# Altium schematic symbol library AA_Symbols.SchLib: 1017 symbols (part 7 of 7) (continued)
## SJA1105
designator U?
Ethernet Switch IEEE 802.3 SPI Interface 159-LFBGA (12x12); Manufacturer: NXP; Outset P/N: PN-0008215
footprint BGA159NP80A14X14_1200X1200X150B45N (Ball Grid Array (BGA, Non-collapsing), 0.80 mm pitch, square; 173 pin, 12.00 mm L X 12.00 mm W X 1.50 mm H body)
part A pins: A1 VSS (power), A14 VSS (power), B13 VSS (power), E5 VSS (power), E6 VSS (power), E7 VSS (power), E8 VSS (power), E9 VSS (power), E10 VSS (power), F5 VSS (power), F6 VSS (power), F7 VSS (power), F8 VSS (power), F9 VSS (power), F10 VSS (power), G5 VSS (power), G6 VSS (power), G7 VSS (power), G8 VSS (power), G9 VSS (power), G10 VSS (power), H5 VSS (power), H6 VSS (power), H7 VSS (power), H8 VSS (power), H9 VSS (power), H10 VSS (power), J5 VSS (power), J6 VSS (power), J7 VSS (power), J8 VSS (power), J9 VSS (power), J10 VSS (power), K4 VSS (power), K5 VSS (power), K6 VSS (power), K7 VSS (power), K8 VSS (power), K9 VSS (power), K10 VSS (power), L4 i.c. (power), L7 VSS (power), N2 VSS (power), N13 VSS (power), P1 VSS (power), P14 VSS (power)
part B pins: D4 VDDIO_MII0 (power), D5 VDDIO_MII1 (power), D6 VDD_CORE (power), D7 VDDIO_MII1 (power), D8 VDDIO_MII1 (power), D9 VDD_CORE (power), D10 VDDIO_MII2 (power), D11 VDDIO_MII2 (power), E4 VDDIO_MII0 (power), E11 VDDIO_MII2 (power), F4 VDD_CORE (power), F11 VDD_CORE (power), G4 VDDIO_MII0 (power), G11 VDDIO_MII3 (power), H11 VDDIO_MII3 (power), J4 VDD_CORE (power), J11 VDD_CORE (power), K11 VDDIO_MII3 (power), L5 VDDIO_HOST (power), L6 VDD_CORE (power), L8 VDDIO_MII4 (power), L9 VDD_CORE (power), L10 VDDIO_MII4 (power), L11 VDDIO_MII4 (power), N4 PTP_CLK (out), P3 ~{RST} (in)
part C pins: H1 CLK_OUT (out), H4 VDDIO_CLO (power), J1 VDDA_PLL (power), J2 VSSA_PLL (power), K1 VDDA_OSC (power), K2 OSC_IN (in), L1 OSC_OUT (out), L2 VSSA_OSC (power)
part D pins: M1 ~{TRST} (in), M2 TDI (in), N1 TCK (in), N3 TDO (out), N5 SDI (in), N6 ~{SS} (in), P2 TMS (in), P4 SDO (out), P5 SCK (in)
part E pins: A2 MII0_TXD0 (out), A3 MII0_TX_ER (out), B1 MII0_TXD1 (out), C1 MII0_TXD3 (out), C2 MII0_TXD2 (out), D1 MII0_TX_CLK (power), D2 MII0_TX_EN (out), E1 MII0_RXD0 (in), E2 MII0_RX_CLK (power), F1 MII0_RXD2 (in), F2 MII0_RXD1 (in), G1 MII0_RX_DV (in), G2 MII0_RXD3 (in), H2 MII0_RX_ER (in)
part F pins: A4 MII1_RX_DV (in), A5 MII1_RXD2 (in), A6 MII1_RXD0 (in), A7 MII1_TX_CLK (power), A8 MII1_TXD3 (out), A9 MII1_TXD1 (out), A10 MII1_TX_ER (out), B3 MII1_RX_ER (in), B4 MII1_RXD3 (in), B5 MII1_RXD1 (in), B6 MII1_RX_CLK (power), B7 MII1_TX_EN (out), B8 MII1_TXD2 (out), B9 MII1_TXD0 (out)
part G pins: A11 MII2_RX_DV (in), A12 MII2_RXD2 (in), A13 MII2_RXD0 (in), B10 MII2_RX_ER (in), B11 MII2_RXD3 (in), B12 MII2_RXD1 (in), B14 MII2_RX_CLK (power), C13 MII2_TX_EN (out), C14 MII2_TX_CLK (power), D13 MII2_TXD2 (out), D14 MII2_TXD3 (out), E13 MII2_TXD0 (out), E14 MII2_TXD1 (out), F14 MII2_TX_ER (out)
part H pins: F13 MII3_RX_ER (in), G13 MII3_RXD3 (in), G14 MII3_RX_DV (in), H13 MII3_RXD1 (in), H14 MII3_RXD2 (in), J13 MII3_RX_CLK (power), J14 MII3_RXD0 (in), K13 MII3_TX_EN (out), K14 MII3_TX_CLK (power), L13 MII3_TXD2 (out), L14 MII3_TXD3 (out), M13 MII3_TXD0 (out), M14 MII3_TXD1 (out), N14 MII3_TX_ER (out)
part I pins: N7 MII4_TXD1 (out), N8 MII4_TXD3 (out), N9 MII4_TX_CLK (power), N10 MII4_RXD0 (in), N11 MII4_RXD2 (in), N12 MII4_RX_DV (in), P6 MII4_TX_ER (out), P7 MII4_TXD0 (out), P8 MII4_TXD2 (out), P9 MII4_TX_EN (out), P10 MII4_RX_CLK (power), P11 MII4_RXD1 (in), P12 MII4_RXD3 (in), P13 MII4_RX_ER (in)
part C text: CGU
part D text: SPI; JTAG
part E text: MII0
part F text: MII1
part G text: MII2
part H text: MII3
part I text: MII4

## STANDOFF_STEEL_M2.5_H5MM
designator M?, comment Manufacturer P/N: 9774050151R  (hidden comment: M2.5/H5MM)  (net tie, no BOM)
ROUND STANDOFF M2.5 STEEL 5MM; Manufacturer: Wurth Electronics; Outset P/N: PN-0001700; Value: M2.5/H5MM
footprint NUV_NET_TIE_0201 (Footprint not found)
footprint STANDOFF_WURTH_9774050151R (M2.5 X 5MM, SMT, PCB MOUNT)
pins: 1

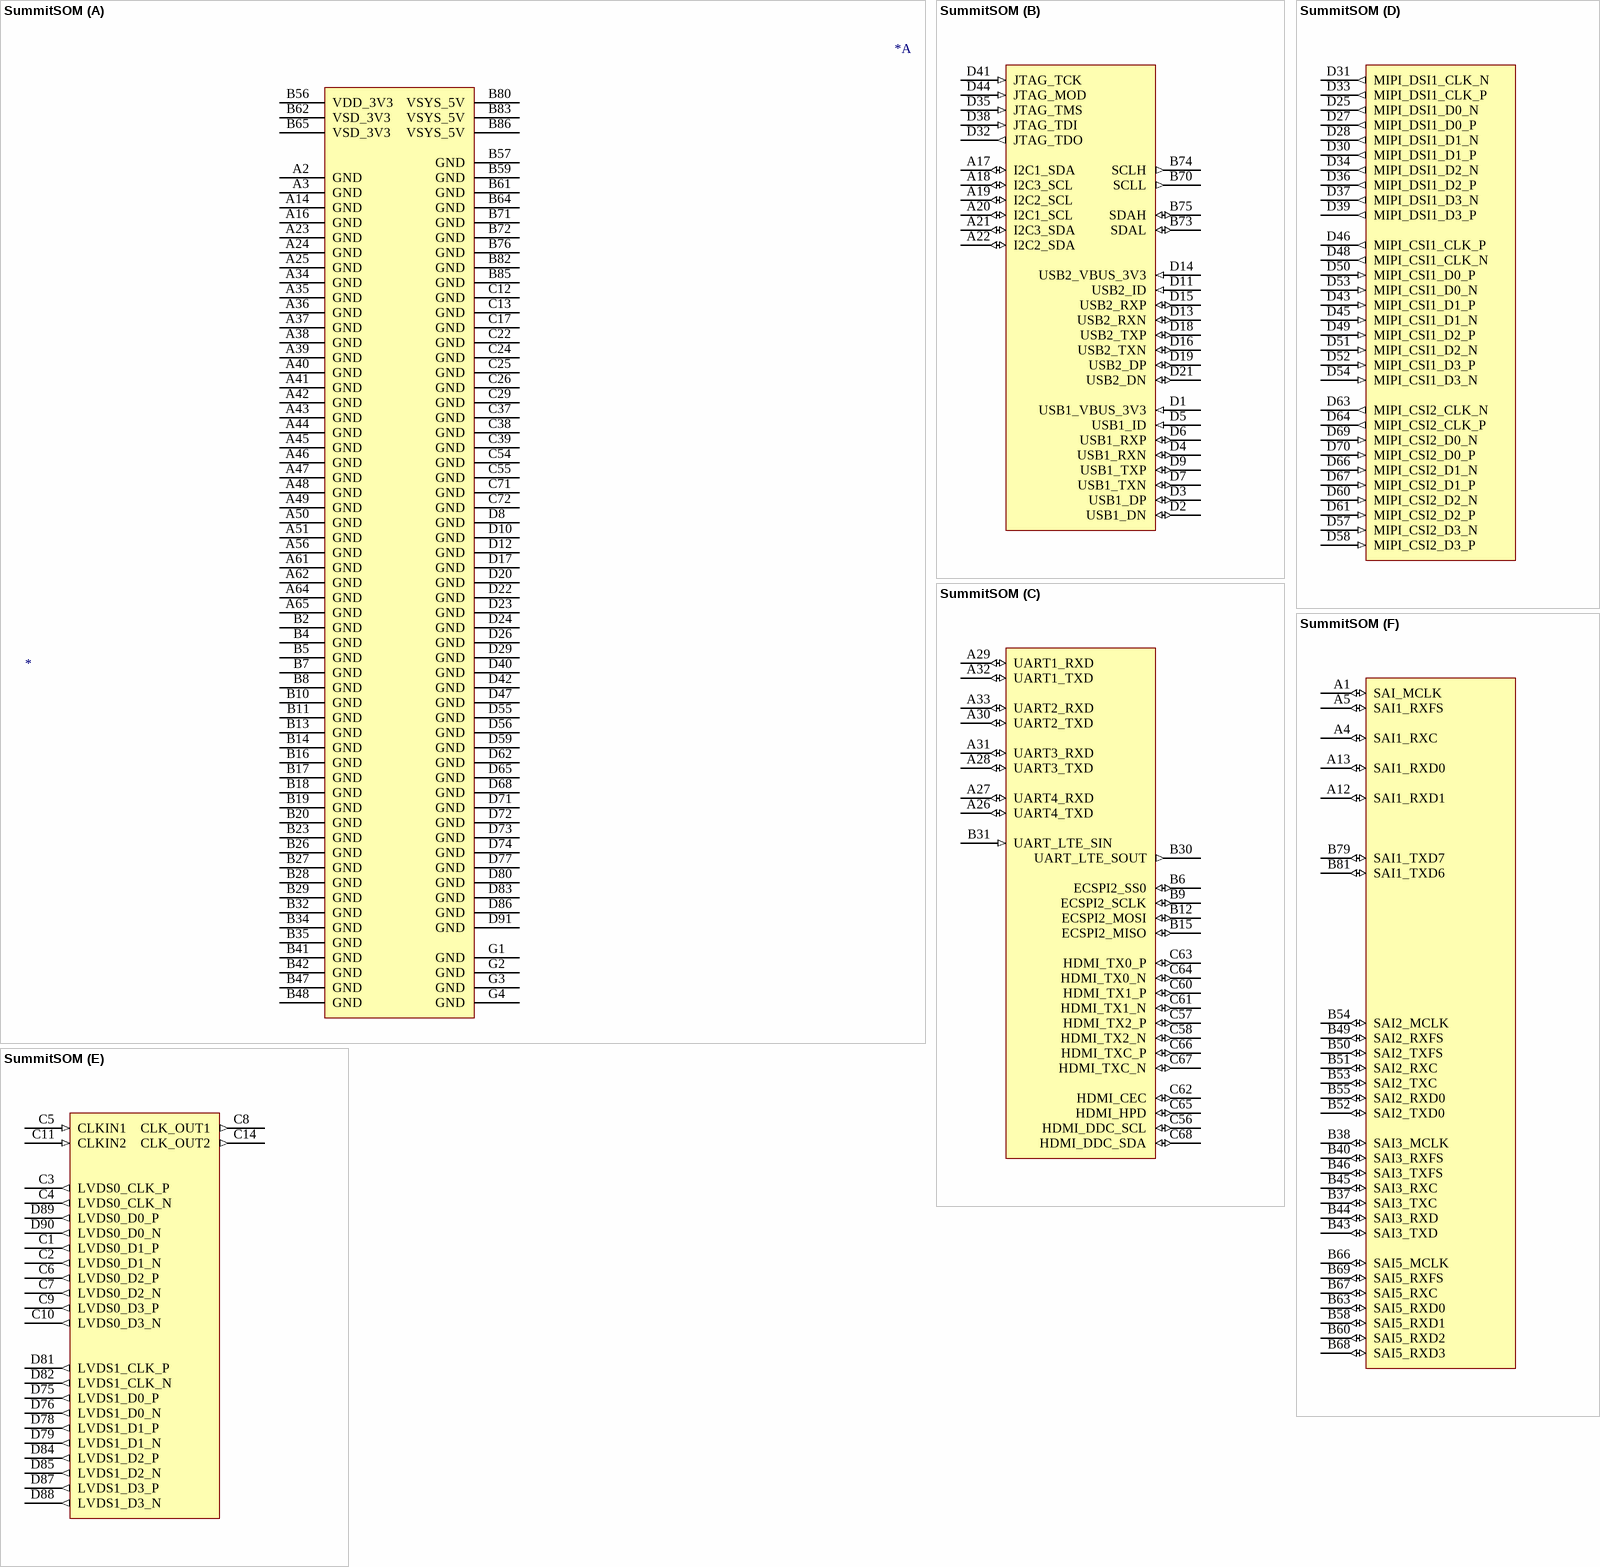
[diagram p40: symbol SummitSOM]

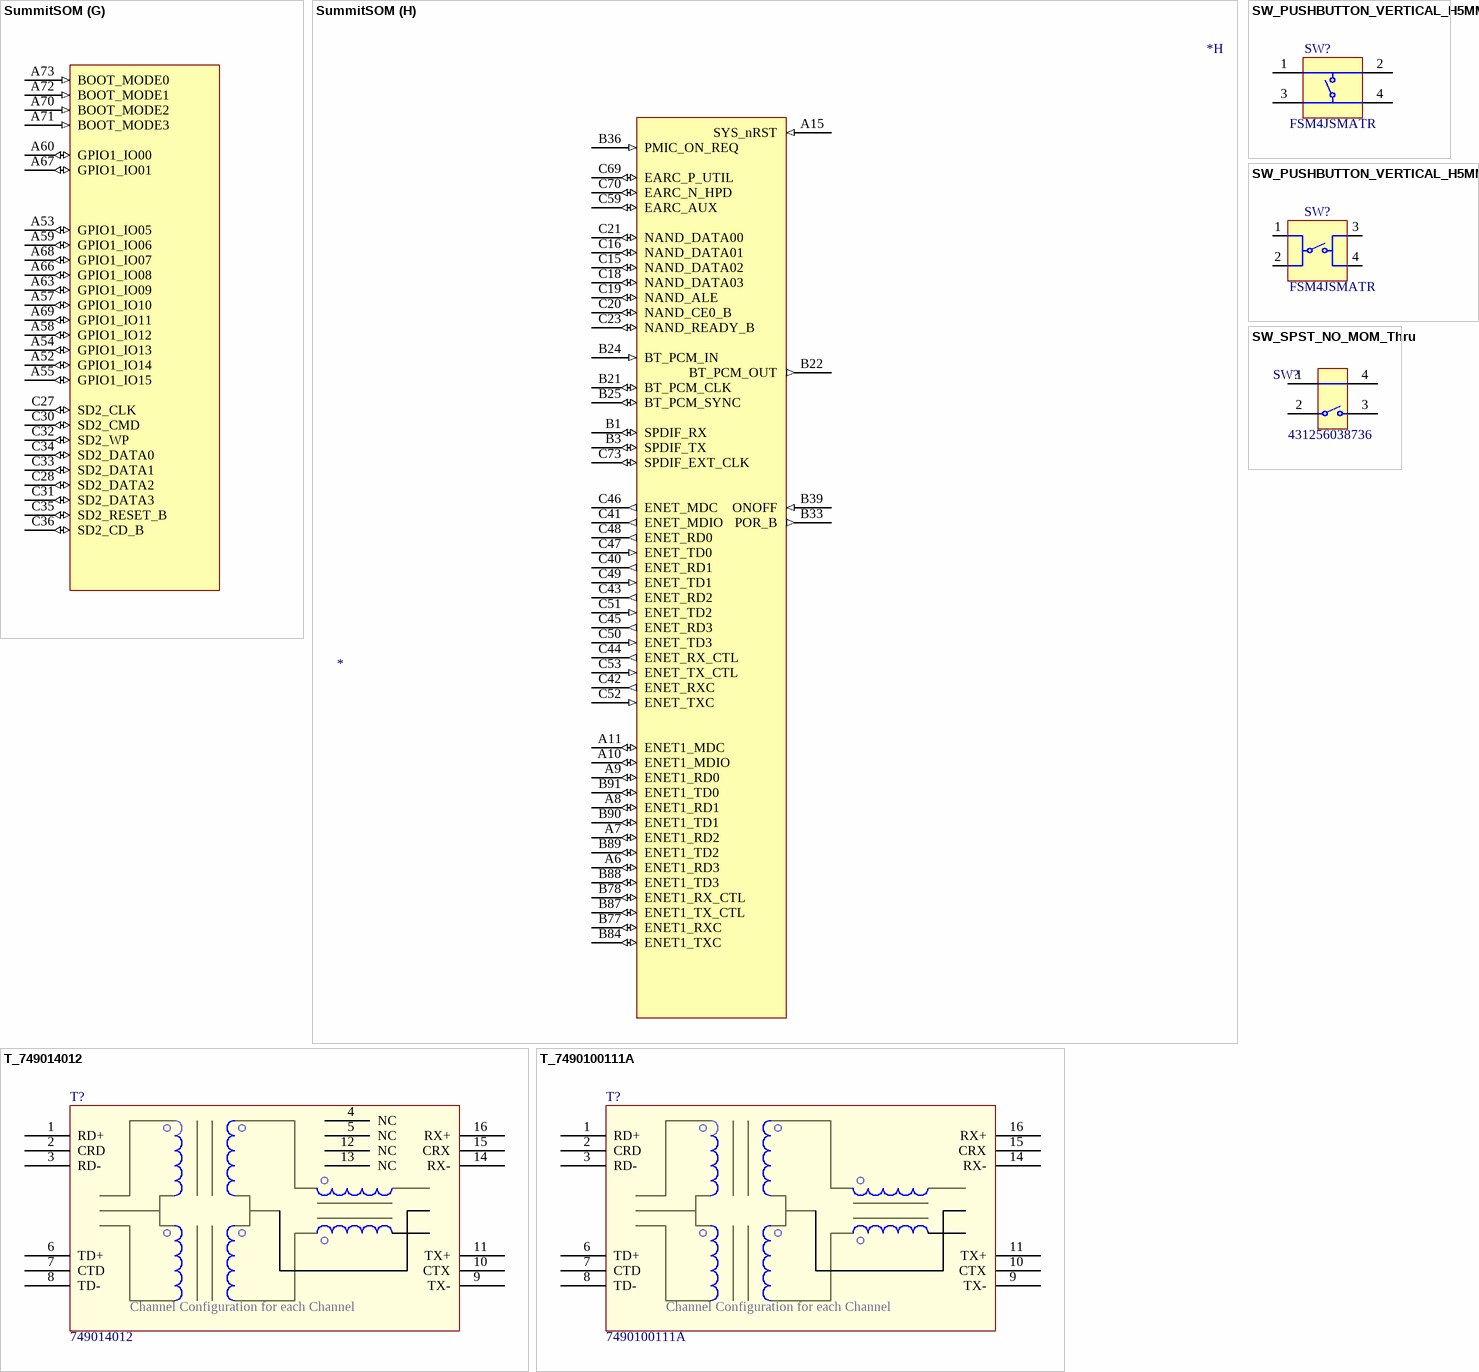
[diagram p41: symbols SummitSOM to T_7490100111A]

## SummitSOM
designator *
footprint SUMMITSOM_8M (Laird, TurboSOM, Platform Side)
part A pins: A2 GND (power), A3 GND (power), A14 GND (power), A16 GND (power), A23 GND (power), A24 GND (power), A25 GND (power), A34 GND (power), A35 GND (power), A36 GND (power), A37 GND (power), A38 GND (power), A39 GND (power), A40 GND (power), A41 GND (power), A42 GND (power), A43 GND (power), A44 GND (power), A45 GND (power), A46 GND (power), A47 GND (power), A48 GND (power), A49 GND (power), A50 GND (power), A51 hidden, A51 GND (power), A56 GND (power), A61 GND (power), A62 GND (power), A64 GND (power), A65 GND (power), B2 GND (power), B4 GND (power), B5 GND (power), B7 GND (power), B8 GND (power), B10 GND (power), B11 GND (power), B13 GND (power), B14 GND (power), B16 GND (power), B17 GND (power), B18 GND (power), B19 GND (power), B20 GND (power), B23 GND (power), B26 GND (power), B27 GND (power), B28 GND (power), B29 GND (power), B32 GND (power), B34 GND (power), B35 GND (power), B41 GND (power), B42 GND (power), B47 GND (power), B48 GND (power), B56 VDD_3V3 (power), B57 GND (power), B59 GND (power), B61 GND (power), B62 VSD_3V3 (power), B64 GND (power), B65 VSD_3V3 (power), B71 GND (power), B72 GND (power), B76 GND (power), B80 VSYS_5V (power), B82 GND (power), B83 VSYS_5V (power), B85 GND (power), B86 VSYS_5V (power), C12 GND (power), C13 GND (power), C17 GND (power), C22 GND (power), C24 GND (power), C25 GND (power), C26 GND (power), C29 GND (power), C37 GND (power), C38 GND (power), C39 GND (power), C54 GND (power), C55 GND (power), C71 GND (power), C72 GND (power), D8 GND (power), D10 GND (power), D12 GND (power), D17 GND (power), D20 GND (power), D22 GND (power), D23 GND (power), D24 GND (power), D26 GND (power), D29 GND (power), D40 GND (power), D42 GND (power), D47 GND (power), D55 GND (power), D56 GND (power), D59 GND (power), D62 GND (power), D65 GND (power), D68 GND (power), D71 GND (power), D72 GND (power), D73 GND (power), D74 GND (power), D77 GND (power), D80 GND (power), D83 GND (power), D86 GND (power), D91 GND (power), G1 GND (power), G2 GND (power), G3 GND (power), G4 GND (power)
part B pins: A17 I2C1_SDA (io), A18 I2C3_SCL (io), A19 I2C2_SCL (io), A20 I2C1_SCL (io), A21 I2C3_SDA (io), A22 I2C2_SDA (io), B70 SCLL (out), B73 SDAL (io), B74 SCLH (out), B75 SDAH (io), D1 USB1_VBUS_3V3 (in), D2 USB1_DN (io), D3 USB1_DP (io), D4 USB1_RXN (io), D5 USB1_ID (in), D6 USB1_RXP (io), D7 USB1_TXN (io), D9 USB1_TXP (io), D11 USB2_ID (in), D13 USB2_RXN (io), D14 USB2_VBUS_3V3 (in), D15 USB2_RXP (io), D16 USB2_TXN (io), D18 USB2_TXP (io), D19 USB2_DP (io), D21 USB2_DN (io), D32 JTAG_TDO (out), D35 JTAG_TMS (in), D38 JTAG_TDI (in), D41 JTAG_TCK (in), D44 JTAG_MOD (in)
part C pins: A26 UART4_TXD (io), A27 UART4_RXD (io), A28 UART3_TXD (io), A29 UART1_RXD (io), A30 UART2_TXD (io), A31 UART3_RXD (io), A32 UART1_TXD (io), A33 UART2_RXD (io), B6 ECSPI2_SS0 (io), B9 ECSPI2_SCLK (io), B12 ECSPI2_MOSI (io), B15 ECSPI2_MISO (io), B30 UART_LTE_SOUT (out), B31 UART_LTE_SIN (in), C56 HDMI_DDC_SCL (io), C57 HDMI_TX2_P (io), C58 HDMI_TX2_N (io), C60 HDMI_TX1_P (io), C61 HDMI_TX1_N (io), C62 HDMI_CEC (io), C63 HDMI_TX0_P (io), C64 HDMI_TX0_N (io), C65 HDMI_HPD (io), C66 HDMI_TXC_P (io), C67 HDMI_TXC_N (io), C68 HDMI_DDC_SDA (io)
part D pins: D25 MIPI_DSI1_D0_N (out), D27 MIPI_DSI1_D0_P (out), D28 MIPI_DSI1_D1_N (out), D30 MIPI_DSI1_D1_P (out), D31 MIPI_DSI1_CLK_N (out), D33 MIPI_DSI1_CLK_P (out), D34 MIPI_DSI1_D2_N (out), D36 MIPI_DSI1_D2_P (out), D37 MIPI_DSI1_D3_N (out), D39 MIPI_DSI1_D3_P (out), D43 MIPI_CSI1_D1_P (in), D45 MIPI_CSI1_D1_N (in), D46 MIPI_CSI1_CLK_P (out), D48 MIPI_CSI1_CLK_N (out), D49 MIPI_CSI1_D2_P (in), D50 MIPI_CSI1_D0_P (in), D51 MIPI_CSI1_D2_N (in), D52 MIPI_CSI1_D3_P (in), D53 MIPI_CSI1_D0_N (in), D54 MIPI_CSI1_D3_N (in), D57 MIPI_CSI2_D3_N (in), D58 MIPI_CSI2_D3_P (in), D60 MIPI_CSI2_D2_N (in), D61 MIPI_CSI2_D2_P (in), D63 MIPI_CSI2_CLK_N (out), D64 MIPI_CSI2_CLK_P (out), D66 MIPI_CSI2_D1_N (in), D67 MIPI_CSI2_D1_P (in), D69 MIPI_CSI2_D0_N (in), D70 MIPI_CSI2_D0_P (in)
part E pins: C1 LVDS0_D1_P (out), C2 LVDS0_D1_N (out), C3 LVDS0_CLK_P (out), C4 LVDS0_CLK_N (out), C5 CLKIN1 (in), C6 LVDS0_D2_P (out), C7 LVDS0_D2_N (out), C8 CLK_OUT1 (out), C9 LVDS0_D3_P (out), C10 LVDS0_D3_N (out), C11 CLKIN2 (in), C14 CLK_OUT2 (out), D75 LVDS1_D0_P (out), D76 LVDS1_D0_N (out), D78 LVDS1_D1_P (out), D79 LVDS1_D1_N (out), D81 LVDS1_CLK_P (out), D82 LVDS1_CLK_N (out), D84 LVDS1_D2_P (out), D85 LVDS1_D2_N (out), D87 LVDS1_D3_P (out), D88 LVDS1_D3_N (out), D89 LVDS0_D0_P (out), D90 LVDS0_D0_N (out)
part F pins: A1 SAI_MCLK (io), A4 SAI1_RXC (io), A5 SAI1_RXFS (io), A12 SAI1_RXD1 (io), A13 SAI1_RXD0 (io), B37 SAI3_TXC (io), B38 SAI3_MCLK (io), B40 SAI3_RXFS (io), B43 SAI3_TXD (io), B44 SAI3_RXD (io), B45 SAI3_RXC (io), B46 SAI3_TXFS (io), B49 SAI2_RXFS (io), B50 SAI2_TXFS (io), B51 SAI2_RXC (io), B52 SAI2_TXD0 (io), B53 SAI2_TXC (io), B54 SAI2_MCLK (io), B55 SAI2_RXD0 (io), B58 SAI5_RXD1 (io), B60 SAI5_RXD2 (io), B63 SAI5_RXD0 (io), B66 SAI5_MCLK (io), B67 SAI5_RXC (io), B68 SAI5_RXD3 (io), B69 SAI5_RXFS (io), B79 SAI1_TXD7 (io), B81 SAI1_TXD6 (io)
part G pins: A52 GPIO1_IO14 (io), A53 GPIO1_IO05 (io), A54 GPIO1_IO13 (io), A55 GPIO1_IO15 (io), A57 GPIO1_IO10 (io), A58 GPIO1_IO12 (io), A59 GPIO1_IO06 (io), A60 GPIO1_IO00 (io), A63 GPIO1_IO09 (io), A66 GPIO1_IO08 (io), A67 GPIO1_IO01 (io), A68 GPIO1_IO07 (io), A69 GPIO1_IO11 (io), A70 BOOT_MODE2 (in), A71 BOOT_MODE3 (in), A72 BOOT_MODE1 (in), A73 BOOT_MODE0 (in), C27 SD2_CLK (io), C28 SD2_DATA2 (io), C30 SD2_CMD (io), C31 SD2_DATA3 (io), C32 SD2_WP (io), C33 SD2_DATA1 (io), C34 SD2_DATA0 (io), C35 SD2_RESET_B (io), C36 SD2_CD_B (io)
part H pins: A6 ENET1_RD3 (io), A7 ENET1_RD2 (io), A8 ENET1_RD1 (io), A9 ENET1_RD0 (io), A10 ENET1_MDIO (io), A11 ENET1_MDC (io), A15 SYS_nRST (in), B1 SPDIF_RX (io), B3 SPDIF_TX (io), B21 BT_PCM_CLK (io), B22 BT_PCM_OUT (out), B24 BT_PCM_IN (in), B25 BT_PCM_SYNC (io), B33 POR_B (out), B36 PMIC_ON_REQ (in), B39 ONOFF (in), B77 ENET1_RXC (io), B78 ENET1_RX_CTL (io), B84 ENET1_TXC (io), B87 ENET1_TX_CTL (io), B88 ENET1_TD3 (io), B89 ENET1_TD2 (io), B90 ENET1_TD1 (io), B91 ENET1_TD0 (io), C15 NAND_DATA02 (io), C16 NAND_DATA01 (io), C18 NAND_DATA03 (io), C19 NAND_ALE (io), C20 NAND_CE0_B (io), C21 NAND_DATA00 (io), C23 NAND_READY_B (io), C40 ENET_RD1 (out), C41 ENET_MDIO (out), C42 ENET_RXC (out), C43 ENET_RD2 (out), C44 ENET_RX_CTL (out), C45 ENET_RD3 (out), C46 ENET_MDC (out), C47 ENET_TD0 (in), C48 ENET_RD0 (out), C49 ENET_TD1 (in), C50 ENET_TD3 (in), C51 ENET_TD2 (in), C52 ENET_TXC (in), C53 ENET_TX_CTL (in), C59 EARC_AUX (io), C69 EARC_P_UTIL (io), C70 EARC_N_HPD (io), C73 SPDIF_EXT_CLK (io)

## SW_PUSHBUTTON_VERTICAL_H5MM
designator SW?, comment FSM4JSMATR
Switch, Single Pole Single Throw, Normally On, Momentary, Surface Mount; Manufacturer: Tyco Electronics; Outset P/N: PN-0001695; Manufacturer P/N: FSM4JSMATR; Value: FSM4JSMATR
footprint SW_TE_FSM4JSMATR (Switch, Tactile, SPST-NO, SMT)
pins: 1, 2, 3, 4

## SW_PUSHBUTTON_VERTICAL_H5MM_ALT
designator SW?, comment FSM4JSMATR
Switch, Single Pole Single Throw, Normally On, Momentary, Surface Mount; Manufacturer: Tyco Electronics; Outset P/N: PN-0001695; Manufacturer P/N: FSM4JSMATR; Value: FSM4JSMATR
footprint SW_TE_FSM4JSMATR (Switch, Tactile, SPST-NO, SMT)
pins: 1, 2, 3, 4

## SW_SPST_NO_MOM_Thru
designator SW?, comment 431256038736
Switch, Single Pole Single Throw, Normally On, Momentary, Through Hole; Manufacturer: Wurth Electronics; Value: 431256083736; Outset P/N: PN-0001672; Manufacturer P/N: 431256083736
footprint 431256083736_4pin (Footprint not found)
pins: 1, 2, 3, 4

## T_749014012
designator T?, comment 749014012
Transformer, Dual WE-LAN 10/100BT, 749014012; Manufacturer: Wurth Electronics; Outset P/N: PN-0001673; Value: 749014012; Manufacturer P/N: 749014012
footprint 749014012_SOIC254P1825X1100-18L26N (Transformer, 2.54 mm pitch; 16 pin,  24.55 mm L X 17 mm W X 11 mm H body)
pins: 1 RD+, 2 CRD, 3 RD-, 4 NC, 5 NC, 6 TD+, 7 CTD, 8 TD-, 9 TX-, 10 CTX, 11 TX+, 12 NC, 13 NC, 14 RX-, 15 CRX, 16 RX+
text: Channel Configuration for each Channel

## T_7490100111A
designator T?, comment 7490100111A
Transformer, Dual, 10/100, 7490100111A, SMT; Manufacturer: Wurth Electronics; Outset P/N: PN-0001774; Manufacturer P/N: 7490100111A; Value: 7490100111A
footprint 7490100111A_SOIC127P940X635-16L50N (Small Outline IC (SOIC), 1.27 mm pitch; 16 pin, 12.70 mm L X 8.80 mm W X 6.35 mm H body)
pins: 1 RD+, 2 CRD, 3 RD-, 6 TD+, 7 CTD, 8 TD-, 9 TX-, 10 CTX, 11 TX+, 14 RX-, 15 CRX, 16 RX+
text: Channel Configuration for each Channel

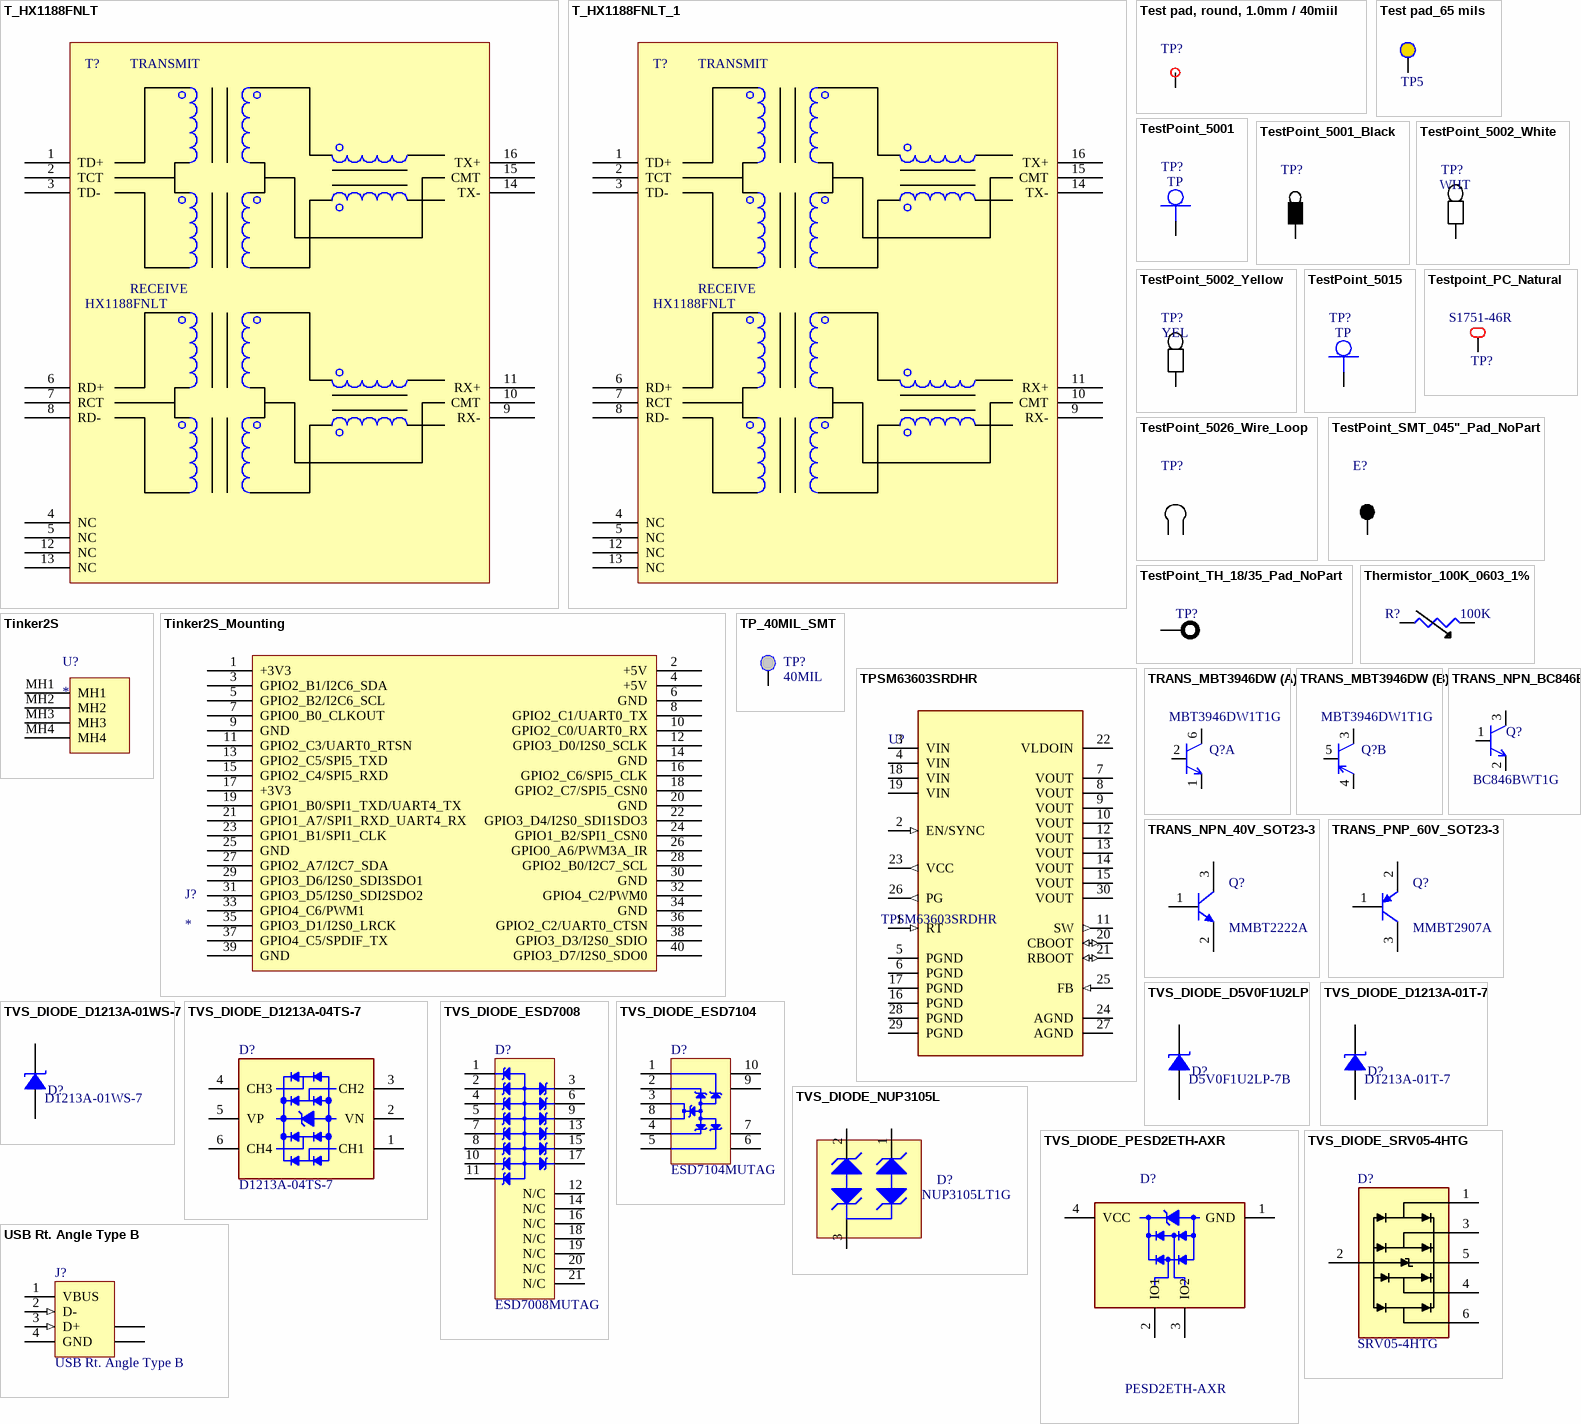
[diagram p42: symbols T_HX1188FNLT to USB Rt. Angle Type B]

## T_HX1188FNLT
designator T?, comment HX1188FNLT
Transformer,Isolation and Data Interface (Encapsulated) Pulse Transformer 1:1 Transmitter, 1:1 Receiver Surface Mount; Manufacturer: Pulse Electronics; Outset P/N: PN-0008394; Value: HX1188FNLT; Manufacturer P/N: HX1188FNLT
footprint SOIC16P127_1270X909X599L100X30N (Small Outline IC (SOIC), 1.27 mm pitch; 16 pin, 12.70 mm L X 9.09 mm W X 5.99 mm H body)
pins: 1 TD+, 2 TCT, 3 TD-, 4 NC, 5 NC, 6 RD+, 7 RCT, 8 RD-, 9 RX-, 10 CMT, 11 RX+, 12 NC, 13 NC, 14 TX-, 15 CMT, 16 TX+
text: TRANSMIT; RECEIVE

## T_HX1188FNLT_1
designator T?, comment HX1188FNLT
Transformer,Isolation and Data Interface (Encapsulated) Pulse Transformer 1:1 Transmitter, 1:1 Receiver Surface Mount; Manufacturer: Pulse Electronics; Value: HX1188FNLT; Manufacturer P/N: HX1188FNLT
pins: 1 TD+, 2 TCT, 3 TD-, 4 NC, 5 NC, 6 RD+, 7 RCT, 8 RD-, 9 RX-, 10 CMT, 11 RX+, 12 NC, 13 NC, 14 TX-, 15 CMT, 16 TX+
text: TRANSMIT; RECEIVE

## Test pad, round, 1.0mm / 40miil
designator TP?  (value not drawn)  (no BOM)
VALUE: Test pad, round, 1.0mm / 40miil
footprint TP_1.0mm_40mils
pins: 1

## Test pad_65 mils
designator TP5  (no BOM)
Test Pad_65 mils
footprint TP_65MILS (Simple SMT Test Pad)
pins: 1 MH

## TestPoint_5001
designator TP?, comment TP
Testpoint, Through Hole, 5001; Manufacturer: Keystone Electronics; Manufacturer P/N: 5001; Outset P/N: 0000318
footprint TestPoint_Thru_Hole
pins: 1 TP

## TestPoint_5001_Black
designator TP?, comment TP  (value not drawn)
Testpoint, Through Hole, 5001, Blk; Manufacturer: Keystone Electronics; Manufacturer P/N: 5001; Outset P/N: 0000318; Distributor: Digi-Key; Distributor P/N: 5001K-ND
footprint TestPoint_Thru_Hole_Black (Black Test Loop)
pins: 1 TP

## TestPoint_5002_White
designator TP?, comment WHT
Testpoint, Through Hole, 5002, White; Manufacturer: Keystone Electronics; Manufacturer P/N: 5002; Outset P/N: PN-0001792; Distributor: Digi-Key; Distributor P/N: 5002K-ND
footprint TestPoint_Thru_Hole_WHITE (White Test Loop)
pins: 1 TP

## TestPoint_5002_Yellow
designator TP?, comment YEL
Testpoint, Through Hole, 5004, Yellow; Manufacturer: Keystone Electronics; Manufacturer P/N: 5004; Outset P/N: PN-0002068; Distributor: Digi-Key; Distributor P/N: 5004K-ND
footprint TestPoint_Thru_Hole_Yel (Yellow Test Loop)
pins: 1 TP

## TestPoint_5015
designator TP?, comment TP
Testpoint, Surface Mount, 5015; Manufacturer: Keystone Electronics; Manufacturer P/N: 5015; Outset P/N: 0000319
footprint SMT_TP_N
pins: 1 TP
1 alternate drawing of the same symbol

## TestPoint_5026_Wire_Loop
designator TP?, comment TP  (value not drawn)
Testpoint, Through Hole, Wire Loop, 5026; Manufacturer: Keystone Electronics; Manufacturer P/N: 5026; Outset P/N: PN-0002470; Supplier 1: Digi-Key; Supplier Part Number 1: 36-5026-ND
footprint CON_TESTPOINT_LOOP_5026 (Testpoint, Keystone Wire Loop 5026)
pins: 1 TP, 2 TP

## Testpoint_PC_Natural
designator TP?, comment S1751-46R
Testpoint, Surface Mount, PC, Natural, S1751-46R; Manufacturer: Harwin; Outset P/N: PN-0007143; Manufacturer P/N: S1751-46R; VALUE: S1751-46R
footprint TP_S1751-46R
pins: 1

## TestPoint_SMT_045"_Pad_NoPart
designator E?  (no BOM)
Testpoint, SMT, 045" Pad, No Part
footprint TESTPOINT_045_PAD (Simple Round SMT Pad, 045")
pins: 1 TP

## TestPoint_TH_18/35_Pad_NoPart
designator TP?  (no BOM)
Testpoint, T/H, 18/35 Pad, No Part
footprint TESTPOINT_THRU_HOLE_18/35 (TESTPOINT THRU HOLE 18/35 NO PART)
pins: 1

## Thermistor_100K_0603_1%
designator R?, comment 100K
Thermistor, 100K, 0603, 1%; Manufacturer: Vishay; Manufacturer P/N: NTCS0603E3104FXT; Outset P/N: 0000320; Value: 100K
footprint RC_1608_0603_N
pins: 1, 2

## Tinker2S
designator U?
footprint TINKER_MOUNTING
pins: MH1, MH2, MH3, MH4

## Tinker2S_Mounting
designator J?
pins: 1 +3V3, 2 +5V, 3 GPIO2_B1/I2C6_SDA, 4 +5V, 5 GPIO2_B2/I2C6_SCL, 6 GND, 7 GPIO0_B0_CLKOUT, 8 GPIO2_C1/UART0_TX, 9 GND, 10 GPIO2_C0/UART0_RX, 11 GPIO2_C3/UART0_RTSN, 12 GPIO3_D0/I2S0_SCLK, 13 GPIO2_C5/SPI5_TXD, 14 GND, 15 GPIO2_C4/SPI5_RXD, 16 GPIO2_C6/SPI5_CLK, 17 +3V3, 18 GPIO2_C7/SPI5_CSN0, 19 GPIO1_B0/SPI1_TXD/UART4_TX, 20 GND, 21 GPIO1_A7/SPI1_RXD_UART4_RX, 22 GPIO3_D4/I2S0_SDI1SDO3, 23 GPIO1_B1/SPI1_CLK, 24 GPIO1_B2/SPI1_CSN0, 25 GND, 26 GPIO0_A6/PWM3A_IR, 27 GPIO2_A7/I2C7_SDA, 28 GPIO2_B0/I2C7_SCL, 29 GPIO3_D6/I2S0_SDI3SDO1, 30 GND, 31 GPIO3_D5/I2S0_SDI2SDO2, 32 GPIO4_C2/PWM0, 33 GPIO4_C6/PWM1, 34 GND, 35 GPIO3_D1/I2S0_LRCK, 36 GPIO2_C2/UART0_CTSN, 37 GPIO4_C5/SPDIF_TX, 38 GPIO3_D3/I2S0_SDIO, 39 GND, 40 GPIO3_D7/I2S0_SDO0

## TP_40MIL_SMT
designator TP?, comment 40MIL  (no BOM)
Testpoint, 40mil, SMT; Value: 40MIL
footprint TP_1016
pins: 1 TP1

## TPSM63603SRDHR
designator U?
Non-Isolated Module DC DC Converter 3A, 3V - 36V Input; Manufacturer: Texas Instruments; Value: TPSM63603SRDHR; Manufacturer P/N: TPSM63603SRDHR
footprint TPSM63603_B0QFN30_TI (QFN, DC-DC module)
pins: 1 RT (in), 2 EN/SYNC (in), 3 VIN (power), 4 VIN (power), 5 PGND (power), 6 PGND (power), 7 VOUT (power), 8 VOUT (power), 9 VOUT (power), 10 VOUT (power), 11 SW (out), 12 VOUT (power), 13 VOUT (power), 14 VOUT (power), 15 VOUT (power), 16 PGND (power), 17 PGND (power), 18 VIN (power), 19 VIN (power), 20 CBOOT (io), 21 RBOOT (io), 22 VLDOIN (power), 23 VCC (out), 24 AGND (power), 25 FB (in), 26 PG (out), 27 AGND (power), 28 PGND (power), 29 PGND (power), 30 VOUT (power)

## TRANS_MBT3946DW
designator Q?, comment MBT3946DW1T1G
Complementary Transistor Pair, SOT-623; Manufacturer: ON Semiconductor; Outset P/N: PN-0002785; Manufacturer P/N: MBT3946DW1T1G; Value: MBT3946DW1T1G
footprint SOT-363 (SOT23, 6-Leads, Body 2.00x2.10mm, Pitch 0.65mm, IPC Medium Density)
part A pins: 1 NPN-E, 2 NPN-B, 6 NPN-C
part B pins: 3 PNP-C, 4 PNP-E, 5 PNP-B

## TRANS_NPN_40V_SOT23-3
designator Q?, comment MMBT2222A
TRANS NPN MMBT2222A 75V 1A SOT23-3; Manufacturer: Diodes Inc; Manufacturer P/N: MMBT2222A-7-F; Value: NPN 75V 1A; Outset P/N: 0000316
footprint SOT-23 (SOT23, 3-Leads, Body 3.0x2.7mm (max), Pitch 0.95mm, IPC Medium Density)
pins: 1 B, 2 E, 3 C

## TRANS_NPN_BC846BW
designator Q?, comment BC846BWT1G
NPN Transistor, SOT-323; Manufacturer: ON Semiconductor; Outset P/N: PN-0002786; Manufacturer P/N: BC846BWT1G; Value: BC846BWT1G
footprint SOT-323 (SOT23, 3-Leads, Body 2.00x2.20mm, Pitch 0.65mm, IPC Medium Density)
pins: 1 NPN-B, 2 NPN-E, 3 NPN-C

## TRANS_PNP_60V_SOT23-3
designator Q?, comment MMBT2907A
TRANS PNP MMBT2907A 60V 800mA SOT23-3; Manufacturer: Diodes Inc; Manufacturer P/N: MMBT2907A-7-F; Value: PNP 60V 800mA; Outset P/N: 0000317
footprint SOT-23 (SOT-23; 3 Leads; Body 3.0 x 2.6 mm, inc. leads (LxW max))
pins: 1 B, 2 E, 3 C

## TVS_DIODE_D5V0F1U2LP
designator D?, comment D5V0F1U2LP-7B
TVS DIODE 5.5VWM 12VC DFN1006-2; Manufacturer: Diodes Incorporated; Outset P/N: PN-0008404; Manufacturer P/N: D5V0F1U2LP-7B; VALUE: D5V0F1U2LP-7B
footprint DIODFN2_100X60X26L25X50N (514AG) (Diode, Dual Flat No-Lead (DFN 2 Pin); 2 pin, 1.00 mm L X 0.60 mm W X 0.26 mm H body)
pins: A, K

## TVS_DIODE_D1213A-01T-7
designator D?, comment D1213A-01T-7
TVS DIODE 3.3VWM 10VC SOD523; Manufacturer: Diodes Incorporated; Outset P/N: PN-0008403; Manufacturer P/N: D1213A-01T-7; VALUE: D1213A-01T-7
footprint SODFL160X80X65L20X30N (SOD523) (Diode, Small Outline Diode Flat Lead (SODFL); 1.20 mm L X 0.80 mm W X 0.65 mm H body)
pins: A, K

## TVS_DIODE_D1213A-01WS-7
designator D?, comment D1213A-01WS-7
TVS Diode 3.3VWM 10VC SOD323; Manufacturer: Diodes Incorporated; Outset P/N: PN-0007150; Manufacturer P/N: D1213A-01WS-7; VALUE: D1213A-01WS-7
footprint SOD250X130X120L30X30N (SOD323)
pins: A, K

## TVS_DIODE_D1213A-04TS-7
designator D?, comment D1213A-04TS-7
TVS Diode 3.3VWM 10VC 4CH TSOT26; Manufacturer: Diodes, Inc; Outset P/N: PN-0007136; Manufacturer P/N: D1213A-04TS-7; Value: D1213A-04TS-7
footprint SOT23-6P95_280X100L40X37N (S6_MO-193)
pins: 1 CH1, 2 VN (power), 3 CH2, 4 CH3, 5 VP (power), 6 CH4

## TVS_DIODE_ESD7008
designator D?, comment ESD7008MUTAG
TVS DIODE 5VWM 10VC 18UDFN; Manufacturer: ON Semiconductor; Manufacturer P/N: ESD7008MUTAG; Value: ESD7008MUTAG
footprint 18UDFN_ESD7008 (8 pin, PowerPak)
pins: 1 I/O, 2 I/O, 3 GND, 4 I/O, 5 I/O, 6 GND, 7 I/O, 8 I/O, 9 GND, 10 I/O, 11 I/O, 12 N/C, 13 GND, 14 N/C, 15 GND, 16 N/C, 17 GND, 18 N/C, 19 N/C, 20 N/C, 21 N/C

## TVS_DIODE_ESD7104
designator D?, comment ESD7104MUTAG
TVS DIODE 5VWM 10VC 10UDFN; Manufacturer: ON Semiconductor; Outset P/N: PN-0002771; Manufacturer P/N: ESD7104MUTAG; Value: ESD7104MUTAG
footprint 10UDFN_ESD7104 (Footprint not found)
pins: 1 I/O, 2 I/O, 3 GND, 4 I/O, 5 I/O, 6 N/C, 7 N/C, 8 GND, 9 N/C, 10 N/C

## TVS_DIODE_NUP3105L
designator D?, comment NUP3105LT1G
TVS DIODE 32VWM 66VC SOT23; Manufacturer: ON Semiconductor; Outset P/N: PN-0001685; Manufacturer P/N: NUP3105LT1G; Value: NUP3105LT1G
footprint NUP3105L_SOT95P240X110-3N (TO-236AB) (SOT,0.95mm,pitch;3 pin,1.30mm W X 2.90mm L X 1.10mm H body)
pins: 1, 2, 3

## TVS_DIODE_PESD2ETH-AXR
designator D?, comment PESD2ETH-AXR
TVS Diode 5.5VWM SOT143B; Manufacturer: Nexperia USA Inc.; Manufacturer P/N: PESD2ETH-AXR; Value: PESD2ETH-AXR
pins: 1 GND, 2 IO1 (power), 3 IO2, 4 VCC

## TVS_DIODE_SRV05-4HTG
designator D?, comment SRV05-4HTG
TVS DIODE, 6VWM, 15VC, SOT23-6; Manufacturer: Littelfuse Inc.; Outset P/N: PN-0007153; Manufacturer P/N: SRV05-4HTG; VALUE: SRV05-4HTG
footprint SOT95P280X145-6N (MO-178AB)
pins: 1 IO1, 2 GND, 3 IO2, 4 IO3, 5 VCC, 6 IO4

## USB Rt. Angle Type B
designator J?
USB 2.0, Right Angle, Thru-Hole, B Type, Receptacle, 4 Position, Black; Manufacturer P/N: 67068-8001; Manufacturer: Molex; OUTSET P/N: PN-0003762
signal-integrity model USB1.1
footprint USB_TypeB_RT_Angle
pins: 1 VBUS (power) "Power", 2 D- (in) "-DATA", 3 D+ (in) "+DATA", 4 GND (power) "Ground", 5 SHLD "Shield", 6 SHLD "Shield"